# Altium footprint library c3_PcbLib.PcbLib: 222 footprints (part 4 of 14)
Each footprint in its own frame and in the unit in brackets; x right, y up, seen from the top. Pads: shape width x height; smd on the part's side, far side on the other; paste and mask are expansions set on the pad; w line width, h text height; cw(c..) or ccw(c..) is an arc to the next point about the centre after c.
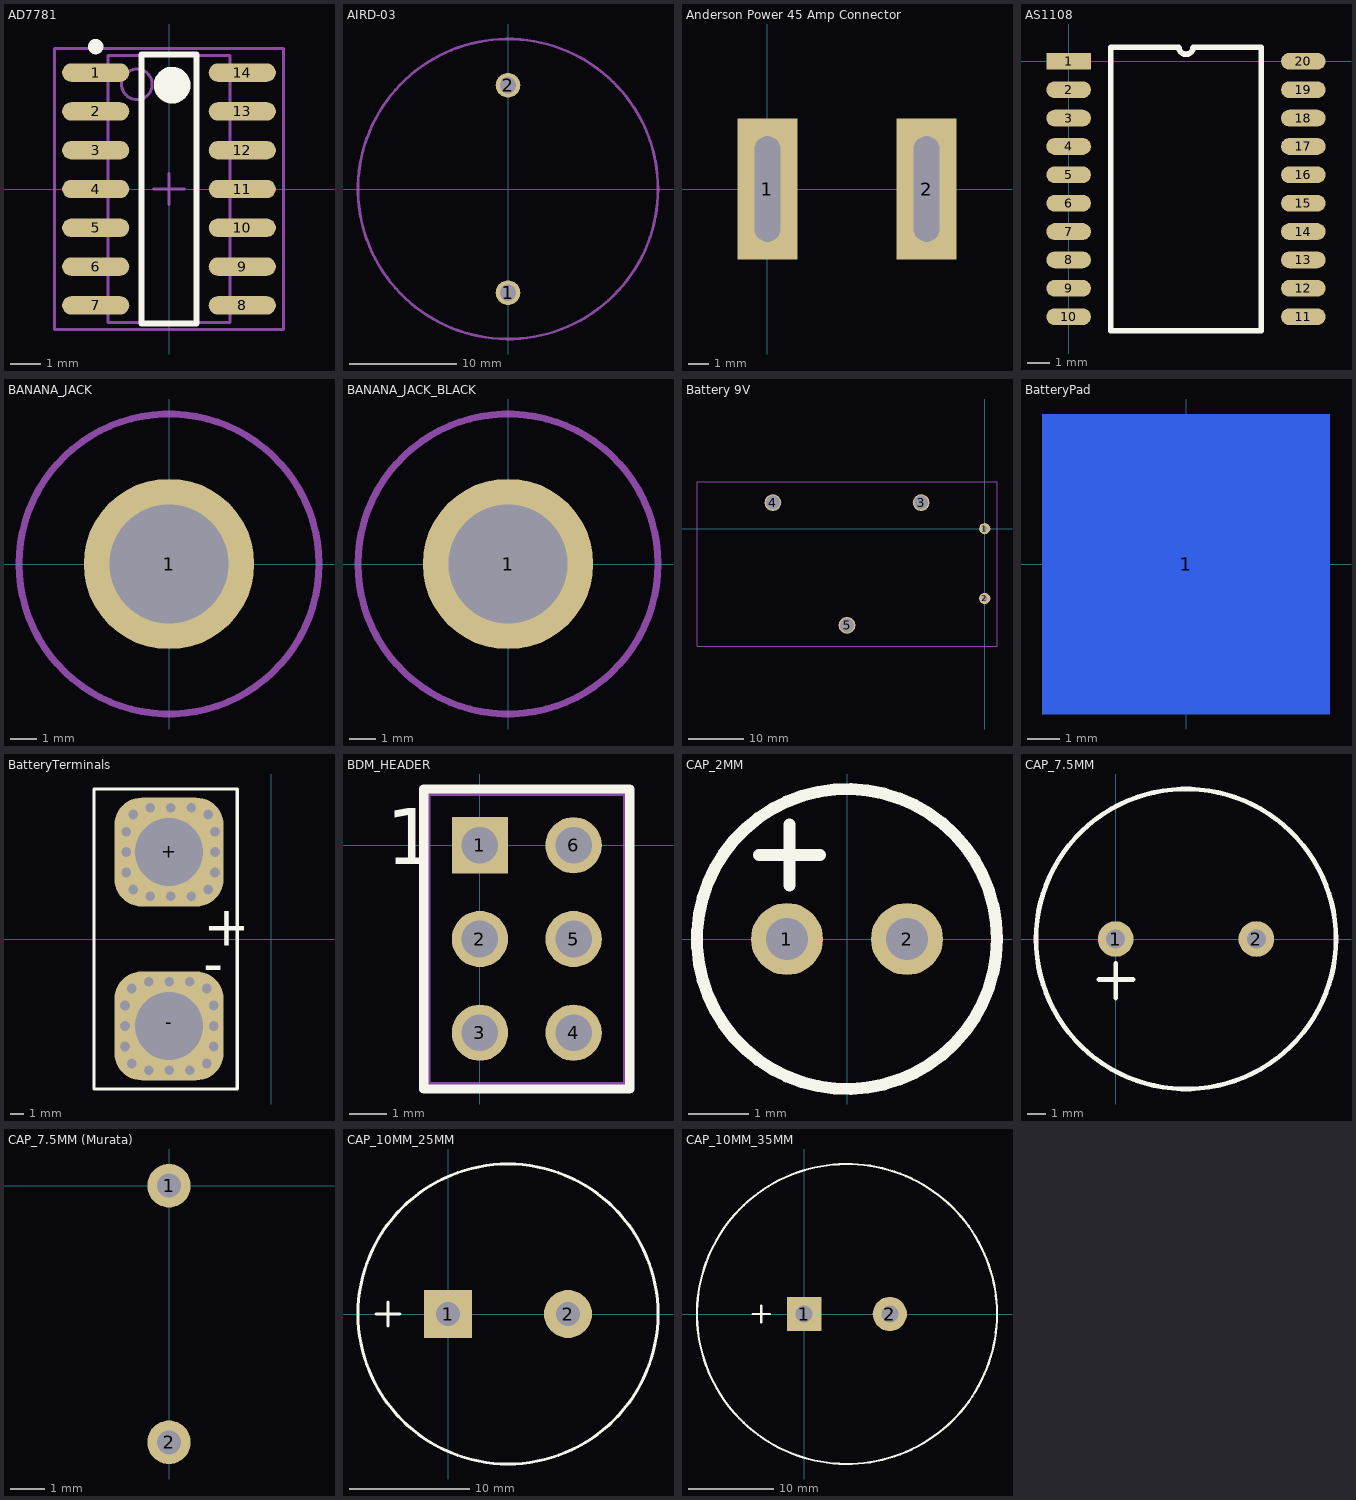
[diagram p3: the footprints below, top view; thin cyan lines are the x and y axes]

## AD7781 [mm]
height 1.75
pads (14):
  oval 2.2x0.6 smd: 1(-2.4,3.81) 2(-2.4,2.54) 3(-2.4,1.27) 4(-2.4,0) 5(-2.4,-1.27) 6(-2.4,-2.54) 7(-2.4,-3.81) 8(2.4,-3.81) 9(2.4,-2.54) 10(2.4,-1.27) 11(2.4,0) 12(2.4,1.27) 13(2.4,2.54) 14(2.4,3.81)
Top Overlay:
  circle w0.6: c0.1,3.4 r0.3
  circle w0.25: c-2.4,4.66 r0.125
  lines w0.2: -0.9,-4.4 0.9,-4.4 0.9,4.4 -0.9,4.4 -0.9,-4.4
Mechanical 13:
  circle w0.1: c-1.05,3.425 r0.5
  lines w0.1: -2,-4.375 2,-4.375 2,4.375 -2,4.375 -2,-4.375
Mechanical 15:
  lines w0.1: -0.5,0 0.5,0 ; 0,-0.5 0,0.5 ; -3.75,-4.6 3.75,-4.6 3.75,4.6 -3.75,4.6 -3.75,-4.6
3D body: height 1.75, standoff 0.1, extent -2,-4.375 2,4.375

## AIRD-03 [mil]
pads (2):
  round 90 hole 60: 1(0,-380) 2(0,380)
Mechanical 13:
  circle w10: c0,0 r550
  circle w5: c0,-380 r25
  circle w5: c0,380 r25
3D body: height 840, standoff 0, extent -550.4,-550.4 550.4,550.4
3D body: height 0, standoff -500, extent -25.47,-405.47 25.47,-354.53
3D body: height 0, standoff -500, extent -25.47,354.53 25.47,405.47

## Anderson Power 45 Amp Connector [mm]
pads (2):
  rect 3x7 hole 1.27 slot 5.23 at 90 deg: 1(0,0) 2(7.9,0)

## AS1108 [mm]
pads (20):
  rect 2x0.75 smd: 1(0,0)
  oval 2x0.75 smd: 2(0,-1.27) 3(0,-2.54) 4(0,-3.81) 5(0,-5.08) 6(0,-6.35) 7(0,-7.62) 8(0,-8.89) 9(0,-10.16) 10(0,-11.43) 11(10.51,-11.43) 12(10.51,-10.16) 13(10.51,-8.89) 14(10.51,-7.62) 15(10.51,-6.35) 16(10.51,-5.08) 17(10.51,-3.81) 18(10.51,-2.54) 19(10.51,-1.27) 20(10.51,0)
Top Overlay:
  lines w0.254: 1.889,-12.065 8.621,-12.065 8.621,0.635 5.572,0.635 cw(c5.255,0.635) 4.937,0.635 1.889,0.635 1.889,-12.065

## BANANA_JACK [mm]
pads (1):
  round 6.35 hole 4.445: 1(0,0)
Mechanical 13:
  circle w0.254: c0,0 r5.588
3D body: height 22.86, standoff -5.08, extent -5.599,-5.599 5.577,5.577

## BANANA_JACK_BLACK [mm]
pads (1):
  round 6.35 hole 4.445: 1(0,0)
Mechanical 13:
  circle w0.254: c0,0 r5.588
3D body: height 22.86, standoff -5.08, extent -5.599,-5.599 5.577,5.577

## Battery 9V [mil]
pads (5):
  round 80 hole 40: 1(0,0) 2(0,-500)
  round 120 hole 100: 3(-456,187) 4(-1518,187) 5(-987,-693)
Mechanical 13:
  lines w8: -2062,-843 -2062,337 88,337 88,-843 -2062,-843
3D body: height 805, standoff 0, extent -2054.5,-843 80.5,342

## Battery Module [mm]
3D body: height 5.89, standoff -60.07, extent -57.722,-61.246 62.928,18.18

## BatteryPad [mil]
pads (1):
  rect 345x360 smd far side: 1(0,0)

## BatteryTerminals [mm]
pads (2):
  rrect50% 8x8 hole 5: +(-7.5,6.375) -(-7.5,-6.375)
via -7.478,-9.627 diameter 1.27 hole 0.711
via -7.478,-3.127 diameter 1.27 hole 0.711
via -4.228,-6.377 diameter 1.27 hole 0.711
via -10.728,-6.377 diameter 1.27 hole 0.711
via -4.728,-3.627 diameter 1.27 hole 0.711
via -10.228,-3.627 diameter 1.27 hole 0.711
via -10.228,-9.127 diameter 1.27 hole 0.711
via -4.728,-9.127 diameter 1.27 hole 0.711
via -4.228,-7.877 diameter 1.27 hole 0.711
via -5.978,-9.627 diameter 1.27 hole 0.711
via -8.978,-9.627 diameter 1.27 hole 0.711
via -10.728,-7.877 diameter 1.27 hole 0.711
via -10.728,-4.877 diameter 1.27 hole 0.711
via -8.978,-3.127 diameter 1.27 hole 0.711
via -5.978,-3.127 diameter 1.27 hole 0.711
via -4.228,-4.877 diameter 1.27 hole 0.711
via -4.126,7.875 diameter 1.27 hole 0.711
via -5.876,9.625 diameter 1.27 hole 0.711
via -8.876,9.625 diameter 1.27 hole 0.711
via -10.626,7.875 diameter 1.27 hole 0.711
via -10.626,4.875 diameter 1.27 hole 0.711
via -8.876,3.125 diameter 1.27 hole 0.711
via -5.876,3.125 diameter 1.27 hole 0.711
via -4.126,4.875 diameter 1.27 hole 0.711
via -10.126,3.625 diameter 1.27 hole 0.711
via -10.126,9.125 diameter 1.27 hole 0.711
via -4.626,9.125 diameter 1.27 hole 0.711
via -10.626,6.375 diameter 1.27 hole 0.711
via -4.126,6.375 diameter 1.27 hole 0.711
via -7.376,9.625 diameter 1.27 hole 0.711
via -7.376,3.125 diameter 1.27 hole 0.711
via -4.626,3.625 diameter 1.27 hole 0.711
Top Overlay:
  lines w0.254: -13,-11 -2.5,-11 -2.5,11 -13,11 -13,-11
  text "-" at -5,-3.25 h3
  text "+" at -5,-0.5 h3

## BDM_HEADER [mil]
pads (6):
  rect 60x60 hole 39: 1(0,0)
  round 60 hole 39: 2(0,-100) 3(0,-200) 4(100,-200) 5(100,-100) 6(100,0)
Top Overlay:
  lines w10: -60,-260 -60,60 160,60 160,-260 -60,-260
  text "1" at -100,-20 h60
Mechanical 13:
  lines w5: -55,-255 -55,55 155,55 155,-255 -55,-255 ; -12.5,-212.5 12.5,-212.5 12.5,-187.5 -12.5,-187.5 -12.5,-212.5 ; -12.5,-112.5 12.5,-112.5 12.5,-87.5 -12.5,-87.5 -12.5,-112.5 ; -12.5,-12.5 12.5,-12.5 12.5,12.5 -12.5,12.5 -12.5,-12.5 ; 87.5,-212.5 112.5,-212.5 112.5,-187.5 87.5,-187.5 87.5,-212.5 ; 87.5,-112.5 112.5,-112.5 112.5,-87.5 87.5,-87.5 87.5,-112.5 ; 87.5,-12.5 87.5,12.5 112.5,12.5 112.5,-12.5 87.5,-12.5
3D body: height 100, standoff 0, extent -54.98,-254.98 154.98,54.98
3D body: height 418, standoff -120, extent -12.48,-112.48 12.48,-87.52
3D body: height 418, standoff -120, extent -12.48,-12.48 12.48,12.48
3D body: height 418, standoff -120, extent 87.52,-212.48 112.48,-187.52
3D body: height 418, standoff -120, extent 87.52,-112.48 112.48,-87.52
3D body: height 418, standoff -120, extent 87.52,-12.48 112.48,12.48
3D body: height 418, standoff -120, extent -12.48,-212.48 12.48,-187.52

## CAP_2MM [mm]
pads (2):
  round 1.2 hole 0.7: 1(-1,0) 2(1,0)
Top Overlay:
  circle w0.2: c0,0 r2.5
  lines w0.2: -1.468,1.4 -0.452,1.4 ; -0.96,0.892 -0.96,1.908
3D body: height 11, standoff -19, extent -2.5,-2.5 2.5,2.5

## CAP_7.5MM [mil]
pads (2):
  round 75 hole 40: 1(0,0) 2(295.28,0)
Top Overlay:
  circle w10: c147.64,0 r314.96
  lines w10: -35,-85 37,-85 ; 0,-124 0,-51

## CAP_7.5MM (Murata) [mm]
pads (2):
  round 1.27 hole 0.7: 1(0,0) 2(0,-7.5)

## CAP_10MM_25MM [mm]
pads (2):
  rect 4x4 hole 2: 1(0,0)
  round 4 hole 2: 2(10,0)
Top Overlay:
  circle w0.254: c5,0 r12.5
  lines w0.254: -6,0 -4,0 ; -5,-1 -5,1
3D body: height 25, standoff 0, extent -7.39,-12.669 17.511,12.282

## CAP_10MM_35MM [mm]
pads (2):
  rect 4x4 hole 2: 1(0,0)
  round 4 hole 2: 2(10,0)
Top Overlay:
  circle w0.254: c5,0 r17.5
  lines w0.254: -6,0 -4,0 ; -5,-1 -5,1
3D body: height 25, standoff 0, extent -12.351,-17.659 22.511,17.272